# Altium footprint library Semiconductor.PcbLib: 73 footprints (part 1 of 5)
Each footprint in its own frame and in the unit in brackets; x right, y up, seen from the top. Pads: shape width x height; smd on the part's side, far side on the other; paste and mask are expansions set on the pad; w line width, h text height; cw(c..) or ccw(c..) is an arc to the next point about the centre after c.
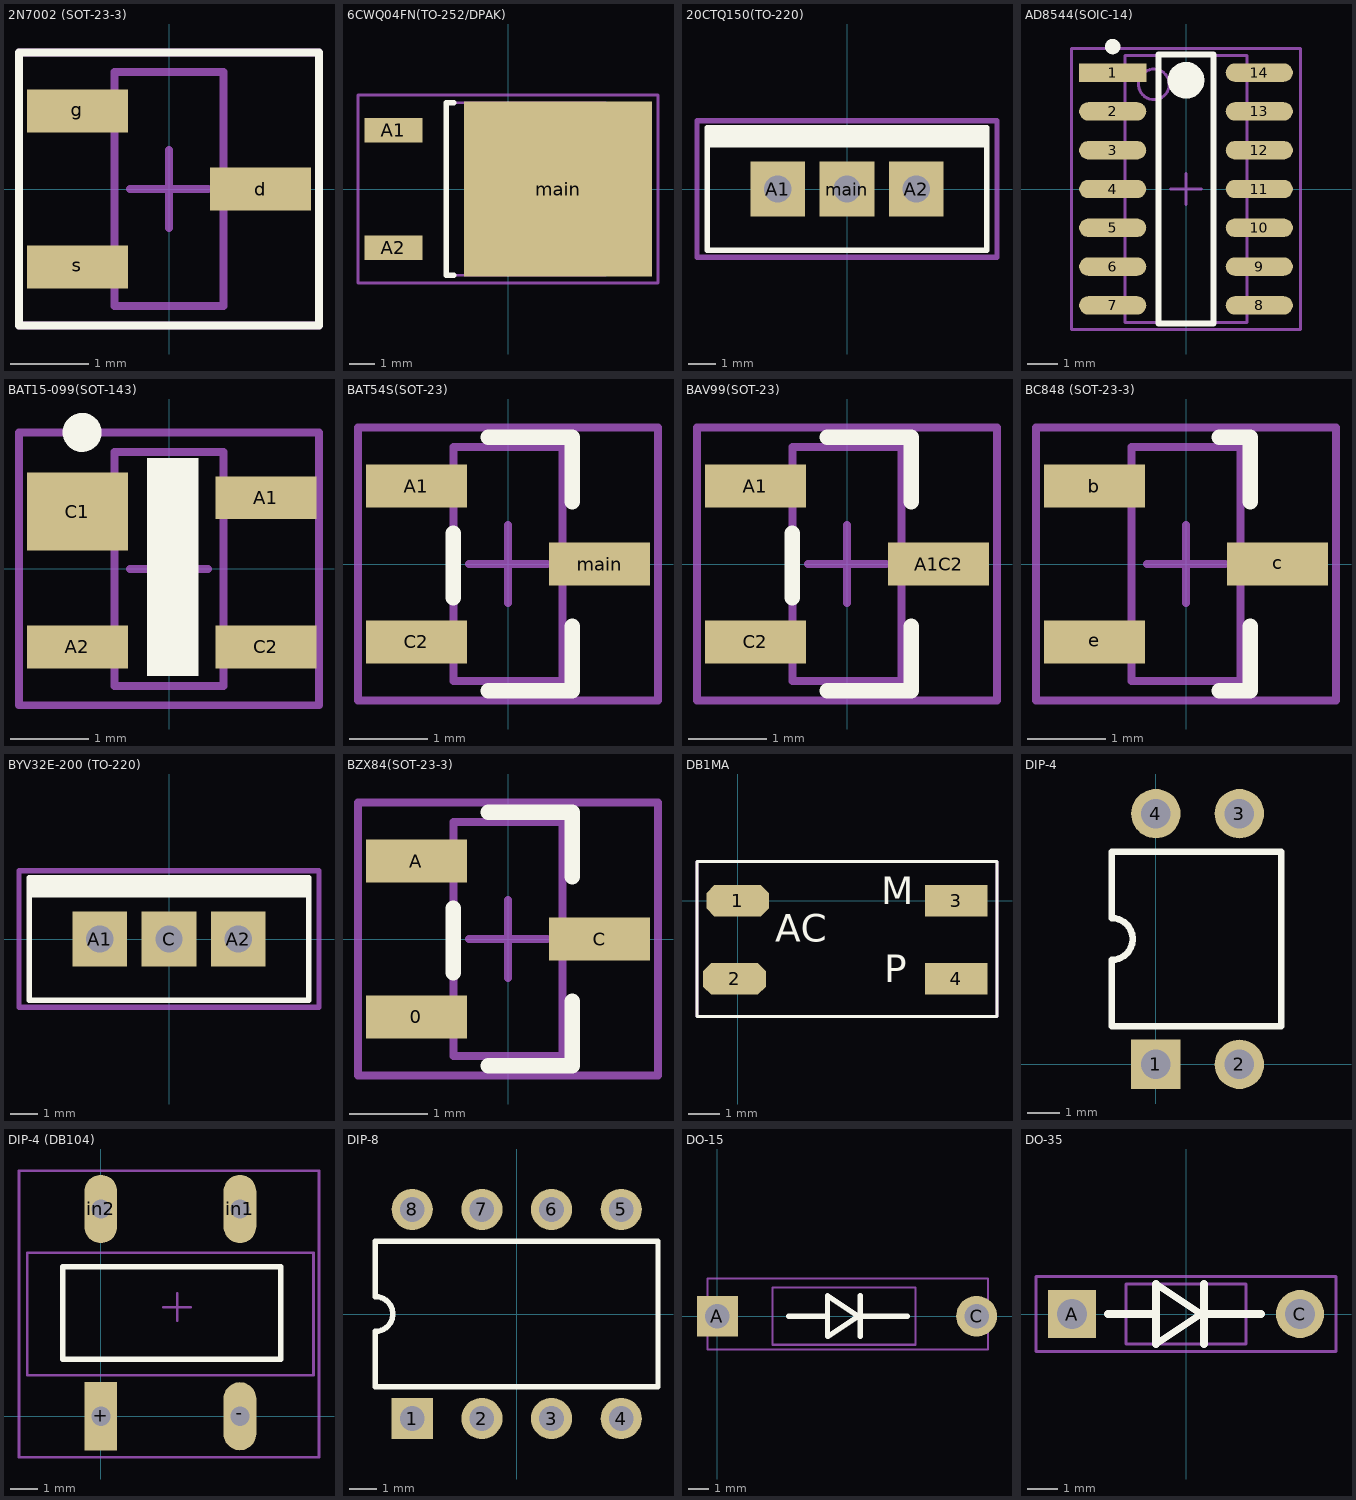
[diagram p0: the footprints below, top view; thin cyan lines are the x and y axes]

## 2N7002 (SOT-23-3) [mm] "SOT23, 3-Leads, Body 3,0x2,6mm (max), Pitch 0,95mm, IPC Medium Density"
height 1.1
pads (3):
  rect 1.3x0.55 smd: d(1.175,0) g(-1.175,1.001) s(-1.175,-1.001)
Top Overlay:
  lines w0.1: -1.925,-1.75 1.925,-1.75 1.925,1.75 -1.925,1.75 -1.925,-1.75
Mechanical 13:
  lines w0.1: -0.7,-1.5 0.7,-1.5 0.7,1.5 -0.7,1.5 -0.7,-1.5
Mechanical 15:
  lines w0.1: -1.4,1.75 -1.2,1.75 ; -0.5,0 0.5,0 ; 0,-0.5 0,0.5 ; -1.925,-1.75 1.925,-1.75 ; -1.925,-1.75 -1.925,1.75 ; -1.925,-1.75 -1.925,1.75 ; -1.925,-1.75 1.925,-1.75 ; -1.925,1.75 1.925,1.75 ; 1.925,-1.75 1.925,1.75 ; 1.925,-1.75 1.925,1.75
3D body: height 1.1, standoff 0, extent -1.271,-1.5 1.271,1.5

## 6CWQ04FN(TO-252/DPAK) [mm]
height 2.39
pads (3):
  rect 2.25x0.95 smd: A1(-4.45,2.28) A2(-4.45,-2.28)
  rect 7.3x6.8 smd: main(1.95,0)
Top Overlay:
  lines w0.2: -2.1,-3.35 -2.4,-3.35 -2.4,3.35 -2.1,3.35
Mechanical 13:
  lines w0.1: -2.4,-3.35 3.8,-3.35 3.8,3.35 -2.4,3.35 -2.4,-3.35
Mechanical 15:
  lines w0.1: -0.5,0 0.5,0 ; 0,-0.5 0,0.5 ; -5.825,-3.65 5.825,-3.65 5.825,3.65 -5.825,3.65 -5.825,-3.65
3D body: height 2.34, standoff -0.07, extent -5.094,-3.25 4.844,3.29

## 20CTQ150(TO-220) [mm] "Два диода ШоТТгэ в корпусе TO-220"
pads (3):
  rect 2x2 hole 1: A1(-2.54,0) A2(2.54,0) main(0,0)
Top Overlay:
  lines w0.2: -5.125,1.625 5.125,1.625 ; -5.125,1.75 5,1.75 5.125,1.875 -5,1.875 -5,2.125 5.125,2.125 ; -5.125,2 5.125,2 ; -5.125,-2.25 5.125,-2.25 5.125,2.25 -5.125,2.25 -5.125,-2.25
Mechanical 15:
  lines w0.2: -5.5,-2.5 5.5,-2.5 5.5,2.5 -5.5,2.5 -5.5,-2.5
3D body: height 18.8, standoff -2.88, extent -4.826,-2.25 4.826,2.25

## AD8544(SOIC-14) [mm] "SOIC, 14-Leads, Body 8,8x4,0mm (max), Pitch 1,27mm, IPC Medium Density"
height 1.75
pads (14):
  rect 2.2x0.6 smd: 1(-2.4,3.81)
  oval 2.2x0.6 smd: 2(-2.4,2.54) 3(-2.4,1.27) 4(-2.4,0) 5(-2.4,-1.27) 6(-2.4,-2.54) 7(-2.4,-3.81) 8(2.4,-3.81) 9(2.4,-2.54) 10(2.4,-1.27) 11(2.4,0) 12(2.4,1.27) 13(2.4,2.54) 14(2.4,3.81)
Top Overlay:
  circle w0.6: c-0.002,3.557 r0.3
  circle w0.25: c-2.4,4.66 r0.125
  lines w0.2: -0.9,-4.4 0.9,-4.4 0.9,4.4 -0.9,4.4 -0.9,-4.4
Mechanical 13:
  circle w0.1: c-1.05,3.425 r0.5
  lines w0.1: -2,-4.375 2,-4.375 2,4.375 -2,4.375 -2,-4.375
Mechanical 15:
  lines w0.1: -0.5,0 0.5,0 ; 0,-0.5 0,0.5 ; -3.75,-4.6 3.75,-4.6 3.75,4.6 -3.75,4.6 -3.75,-4.6
3D body: height 1.55, standoff 0, extent -2.975,-4.357 3.025,4.293

## BAT15-099(SOT-143) [mm]
height 1.1
pads (4):
  rect 1.3x0.55 smd: A1(1.245,0.914) A2(-1.175,-1.001) C2(1.245,-1.001)
  rect 1.3x1 smd: C1(-1.175,0.737)
Top Overlay:
  circle w0.25: c-1.116,1.753 r0.125
  rectangle: -0.279,-1.372 0.381,1.422
Mechanical 13:
  lines w0.1: -0.7,-1.5 0.7,-1.5 0.7,1.5 -0.7,1.5 -0.7,-1.5
Mechanical 15:
  lines w0.1: -0.5,0 0.5,0 ; 0,-0.5 0,0.5 ; -1.925,-1.75 1.925,-1.75 1.925,1.75 -1.925,1.75 -1.925,-1.75
3D body: height 1, standoff 0, extent -1.108,-1.499 1.312,1.421

## BAT54S(SOT-23) [mm]
height 1.1
pads (3):
  rect 1.3x0.55 smd: A1(-1.175,1.001) C2(-1.175,-1.001) main(1.175,0)
Top Overlay:
  lines w0.2: -0.7,-0.432 -0.7,0.393 ; -0.254,-1.625 0.825,-1.625 0.825,-0.8 ; -0.254,1.625 0.825,1.625 0.825,0.8
Mechanical 13:
  lines w0.1: -0.7,-1.5 0.7,-1.5 0.7,1.5 -0.7,1.5 -0.7,-1.5
Mechanical 15:
  lines w0.1: -0.5,0 0.5,0 ; 0,-0.5 0,0.5 ; -1.925,-1.75 1.925,-1.75 1.925,1.75 -1.925,1.75 -1.925,-1.75
3D body: height 1.1, standoff 0, extent -1.271,-1.5 1.271,1.5

## BAV99(SOT-23) [mm]
height 1.1
pads (3):
  rect 1.3x0.55 smd: A1(-1.175,1.001) A1C2(1.175,0) C2(-1.175,-1.001)
Top Overlay:
  lines w0.2: -0.7,-0.432 -0.7,0.393 ; -0.254,-1.625 0.825,-1.625 0.825,-0.8 ; -0.254,1.625 0.825,1.625 0.825,0.8
Mechanical 13:
  lines w0.1: -0.7,-1.5 0.7,-1.5 0.7,1.5 -0.7,1.5 -0.7,-1.5
Mechanical 15:
  lines w0.1: -0.5,0 0.5,0 ; 0,-0.5 0,0.5 ; -1.925,-1.75 1.925,-1.75 1.925,1.75 -1.925,1.75 -1.925,-1.75
3D body: height 1.1, standoff 0, extent -1.271,-1.5 1.271,1.5

## BC848 (SOT-23-3) [mm] "SOT23, 3-Leads, Body 3,0x2,6mm (max), Pitch 0,95mm, IPC Medium Density"
height 1.1
pads (3):
  rect 1.3x0.55 smd: b(-1.175,1.001) c(1.175,0) e(-1.175,-1.001)
Top Overlay:
  lines w0.2: 0.425,-1.625 0.825,-1.625 0.825,-0.8 ; 0.425,1.625 0.825,1.625 0.825,0.8
Mechanical 13:
  lines w0.1: -0.7,-1.5 0.7,-1.5 0.7,1.5 -0.7,1.5 -0.7,-1.5
Mechanical 15:
  lines w0.1: -0.5,0 0.5,0 ; 0,-0.5 0,0.5 ; -1.925,-1.75 1.925,-1.75 1.925,1.75 -1.925,1.75 -1.925,-1.75
3D body: height 1.1, standoff 0, extent -1.271,-1.5 1.271,1.5

## BYV32E-200 (TO-220) [mm] "Два выпрямительных скоростных диода в корпусе TO-220"
pads (3):
  rect 2x2 hole 1: A1(-2.54,0) A2(2.54,0) C(0,0)
Top Overlay:
  lines w0.2: -5.125,1.625 5.125,1.625 ; -5.125,1.75 5,1.75 5.125,1.875 -5,1.875 -5,2.125 5.125,2.125 ; -5.125,2 5.125,2 ; -5.125,-2.25 -5.125,2.25 5.125,2.25 5.125,-2.25 -5.125,-2.25
Mechanical 15:
  lines w0.2: -5.5,-2.5 -5.5,2.5 5.5,2.5 5.5,-2.5 -5.5,-2.5
3D body: height 18.8, standoff -2.88, extent -4.826,-2.25 4.826,2.25

## BZX84(SOT-23-3) [mm]
height 1.1
pads (3):
  rect 1.3x0.55 smd: 0(-1.175,-1.001) A(-1.175,1.001) C(1.175,0)
Top Overlay:
  lines w0.2: -0.7,-0.432 -0.7,0.393 ; -0.254,-1.625 0.825,-1.625 0.825,-0.8 ; -0.254,1.625 0.825,1.625 0.825,0.8
Mechanical 13:
  lines w0.1: -0.7,-1.5 0.7,-1.5 0.7,1.5 -0.7,1.5 -0.7,-1.5
Mechanical 15:
  lines w0.1: -0.5,0 0.5,0 ; 0,-0.5 0,0.5 ; -1.925,-1.75 1.925,-1.75 1.925,1.75 -1.925,1.75 -1.925,-1.75
3D body: height 1.1, standoff 0, extent -1.271,-1.5 1.271,1.5

## DB1MA [mm] "diod bridge"
pads (4):
  oct 2x1 smd: 1(0,0) 2(-0.1,-2.5)
  rect 2x1 smd: 3(7,0) 4(7,-2.5)
Top Overlay:
  lines w0.1: -1.3,-3.7 -1.3,1.25 8.3,1.25 8.3,-3.7 -1.3,-3.7
  text "M" at 4.6,-0.4 h1.5
  text "P" at 4.7,-2.9 h1.5
  text "AC" at 1.2,-1.6 h1.5
Mechanical 29:
  lines w0.1: -1.3,-3.7 -1.3,1.25 8.3,1.25 8.3,-3.7 -1.3,-3.7
  text ".Designator" at 1.9,-0.5 h0.7
3D body: height 3, standoff 0.1, extent -0.5,-3.65 7.1,1.25

## DIP-4 [mm]
pads (4):
  rect 1.5x1.5 hole 0.9: 1(0,0)
  round 1.5 hole 0.9: 2(2.54,0) 3(2.54,7.62) 4(0,7.62)
Top Overlay:
  lines w0.2: -1.34,1.16 -1.34,3.175 ccw(c-1.34,3.81) -1.34,4.445 -1.34,6.46 3.81,6.46 3.81,1.16 -1.34,1.16
3D body: height 4.65, standoff -2.3, extent -1.07,-0.59 3.51,8.21

## DIP-4 (DB104) [mm]
pads (4):
  rect 1.2x2.5 hole 0.7: +(0,0)
  oval 1.2x2.5 hole 0.7: -(5.1,0) in1(5.1,7.6) in2(0,7.6)
Top Overlay:
  lines w0.2: -1.397,2.085 -1.397,5.485 6.6,5.485 6.6,2.085 -1.397,2.085
Mechanical 13:
  lines w0.1: -2.7,1.5 7.8,1.5 7.8,6 -2.7,6 -2.7,1.5
Mechanical 15:
  lines w0.1: 2.3,4 3.3,4 ; 2.8,3.5 2.8,4.5 ; -3,-1.5 -3,9 8,9 8,-1.5 -3,-1.5
3D body: height 3.8, standoff -2.7, extent -1.3,-0.18 6.4,7.803

## DIP-8 [mm]
pads (8):
  rect 1.5x1.5 hole 0.9: 1(-3.81,-3.81)
  round 1.5 hole 0.9: 2(-1.27,-3.81) 3(1.27,-3.81) 4(3.81,-3.81) 5(3.81,3.81) 6(1.27,3.81) 7(-1.27,3.81) 8(-3.81,3.81)
Top Overlay:
  lines w0.2: -5.15,-2.65 5.15,-2.65 5.15,2.65 -5.15,2.65 -5.15,0.635 cw(c-5.15,0) -5.15,-0.635 -5.15,-2.65
3D body: height 5.07, standoff -3.31, extent -4.955,-4.01 4.955,3.81

## DO-15 [mm]
pads (2):
  rect 2x2 hole 1.2: A(0,0)
  round 2 hole 1.2: C(12.7,0)
Top Overlay:
  lines w0.254: 3.5,0 5.4,0 ; 7,-1 7,1 ; 7,0 9.3,0 ; 5.4,-1 5.4,1 6.9,0 5.4,-1
Mechanical 13:
  lines w0.1: 2.7,-1.4 9.7,-1.4 9.7,1.4 2.7,1.4 2.7,-1.4
Mechanical 15:
  lines w0.1: -0.485,-1.641 -0.485,1.856 13.265,1.856 13.265,-1.641 -0.485,-1.641
3D body: height 3.73, standoff -1.8, extent -0.514,-1.754 13.236,1.743

## DO-35 [mm]
pads (2):
  rect 1.6x1.6 hole 1: A(-3.8,0)
  round 1.6 hole 1: C(3.8,0)
Top Overlay:
  lines w0.254: -2.6,0 -1,0 ; 0.6,-1 0.6,1 ; 0.6,0 2.5,0 ; -1,-1 0.5,0 -1,1 -1,-1
Mechanical 13:
  lines w0.1: -2,-1 -2,1 2,1 2,-1 -2,-1
Mechanical 15:
  lines w0.1: -5,-1.25 5,-1.25 5,1.25 -1.525,1.25 -5,1.25 -5,-1.25
3D body: height 2.21, standoff -1.8, extent -4.07,-1.01 4.07,1.01